# Altium schematic symbol library LATTICEPLDS_Library.SchLib: 291 symbols (part 21 of 32) (continued)
## LFE5UM-85F-BG554 (continued)
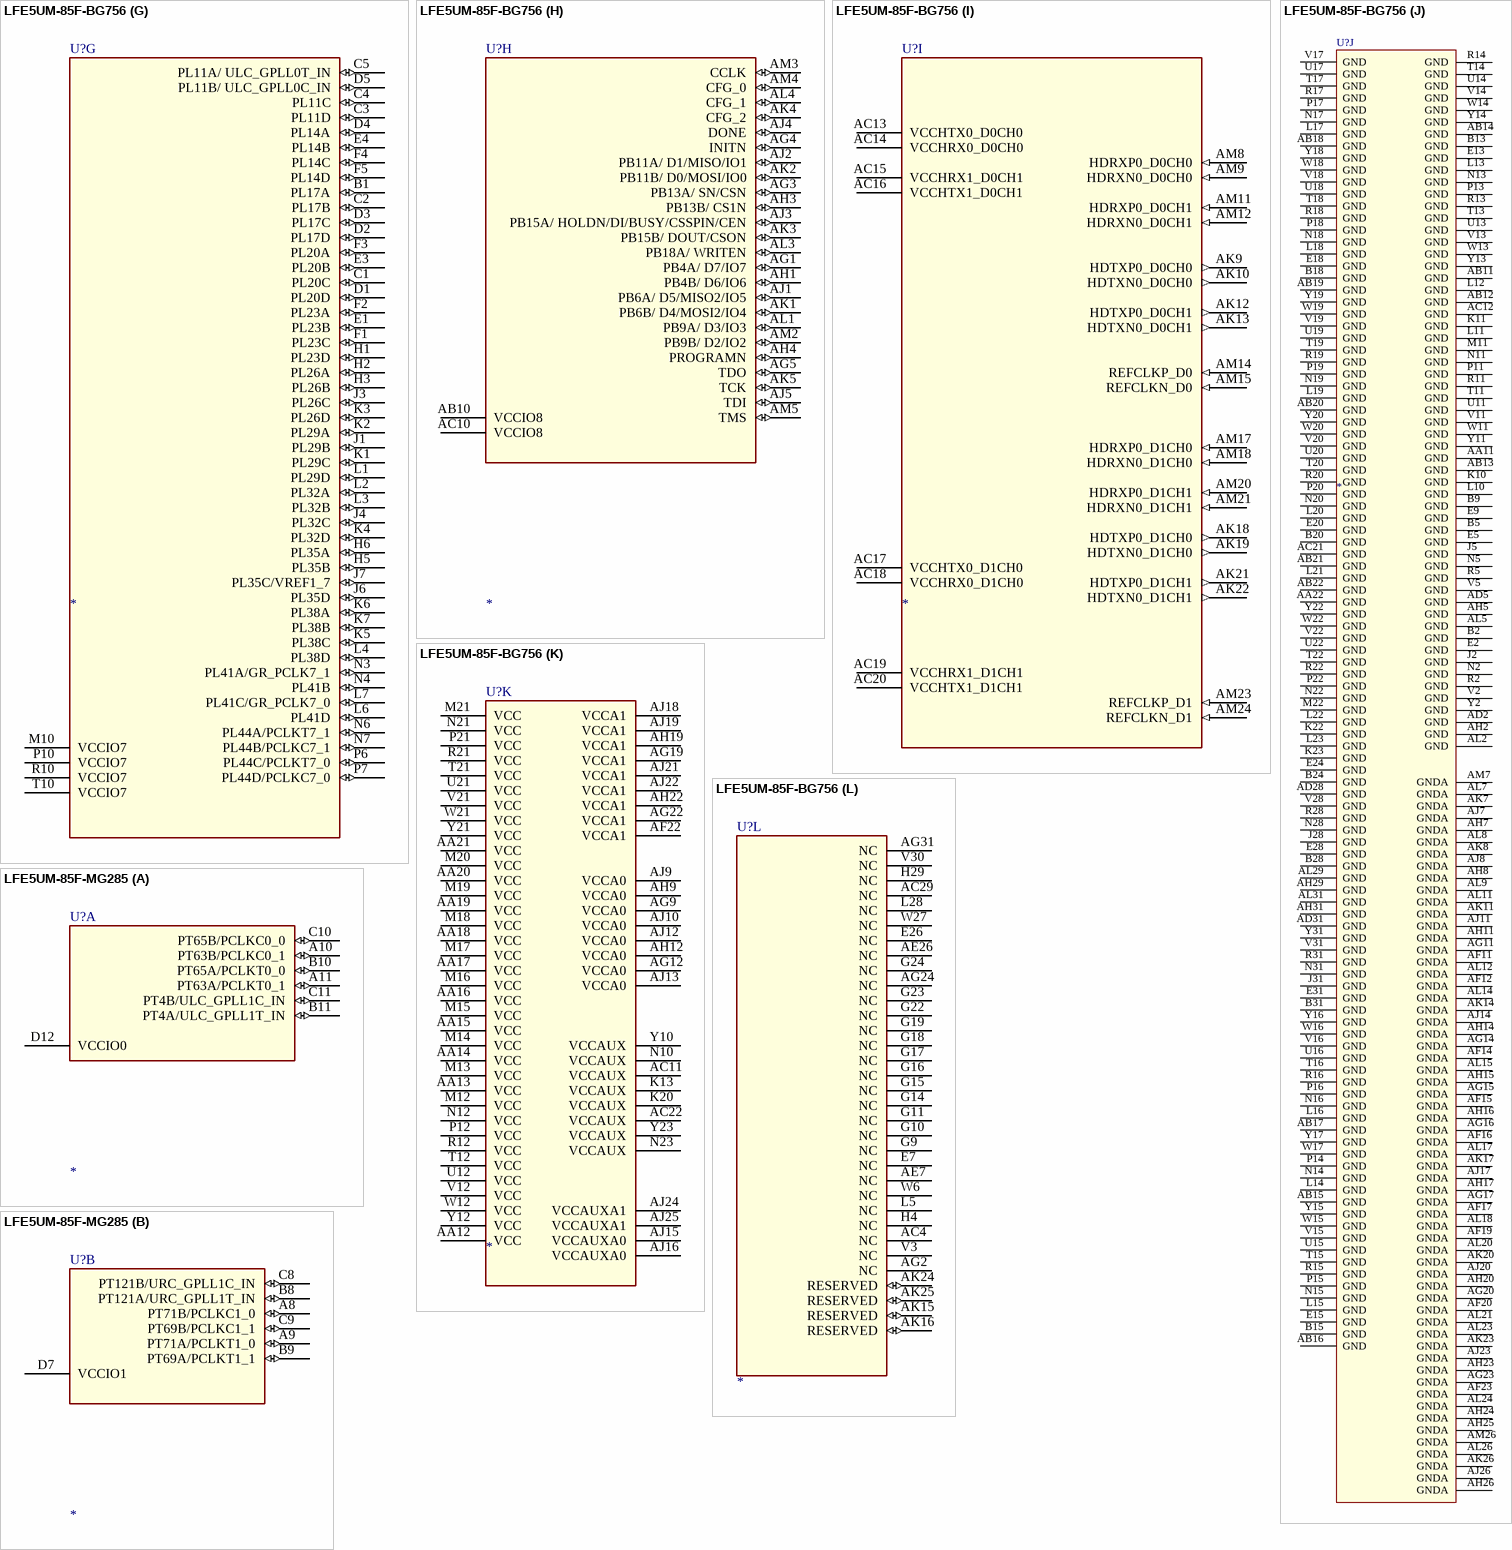
[diagram p203: symbols LFE5UM-85F-BG756 to LFE5UM-85F-MG285]

## LFE5UM-85F-BG756
designator U?
SWAP_INFO: (S1+S2+S3+S4+S5+S6+S7+S8+S9+S10+S11+S12); SPLIT_INST: TRUE
part A pins: A2 PT6A (io), A3 PT6B (io), A4 PT9A (io), A5 PT9B (io), A7 PT13B (io), A8 PT20B (io), A9 PT24B (io), A10 PT31B (io), A11 PT38B (io), A13 PT42B (io), A14 PT49B (io), A15 PT54B (io), A16 PT60B/ GR_PCLK0_0 (io), A17 PT63A/ PCLKT0_1 (io), B3 PT4A/ ULC_GPLL1T_IN (io), B4 PT4B/ ULC_GPLL1C_IN (io), B7 PT13A (io), B8 PT20A (io), B10 PT31A (io), B11 PT38A (io), B14 PT49A (io), B16 PT60A/ GR_PCLK0_1 (io), B17 PT63B/ PCLKC0_1 (io), C7 PT11B (io), C8 PT18B (io), C9 PT24A (io), C10 PT29B (io), C11 PT36B (io), C13 PT42A (io), C14 PT47B (io), C15 PT54A (io), C16 PT58B (io), C17 PT65A/ PCLKT0_0 (io), D7 PT11A (io), D8 PT18A (io), D9 PT22B (io), D10 PT29A (io), D11 PT36A (io), D13 PT40B (io), D14 PT47A (io), D15 PT51B (io), D16 PT58A (io), D17 PT65B/ PCLKC0_0 (io), E8 PT15B (io), E10 PT27B (io), E11 PT33B (io), E14 PT45B (io), E16 PT56B (io), F8 PT15A (io), F9 PT22A (io), F10 PT27A (io), F11 PT33A (io), F13 PT40A (io), F14 PT45A (io), F15 PT51A (io), F16 PT56A (io), K12 VCCIO0 (power), K14 VCCIO0 (power), K15 VCCIO0 (power), K16 VCCIO0 (power)
part B pins: A18 PT71A/ PCLKT1_0 (io), A19 PT76A (io), A20 PT83A (io), A22 PT87A (io), A23 PT94A (io), A24 PT101A (io), A25 PT105A (io), A26 PT112A (io), A28 PT116A (io), A29 PT116B (io), A30 PT119A (io), A31 PT119B (io), B19 PT76B (io), B22 PT87B (io), B23 PT94B (io), B25 PT105B (io), B26 PT112B (io), B29 PT121A/ URC_GPLL1T_IN (io), B30 PT121B/URC_GPLL1C_IN (io), C18 PT71B/ PCLKC1_0 (io), C19 PT78A (io), C20 PT83B (io), C22 PT89A (io), C23 PT96A (io), C24 PT101B (io), C25 PT107A (io), C26 PT114A (io), D18 PT74A/ GR_PCLK1_0 (io), D19 PT78B (io), D20 PT85A (io), D22 PT89B (io), D23 PT96B (io), D24 PT103A (io), D25 PT107B (io), D26 PT114B (io), E17 PT69A/ PCLKT1_1 (io), E19 PT80A (io), E22 PT92A (io), E23 PT98A (io), E25 PT110A (io), F17 PT69B/ PCLKC1_1 (io), F18 PT74B/ GR_PCLK1_1 (io), F19 PT80B (io), F20 PT85B (io), F22 PT92B (io), F23 PT98B (io), F24 PT103B (io), F25 PT110B (io), K17 VCCIO1 (power), K18 VCCIO1 (power), K19 VCCIO1 (power), K21 VCCIO1 (power)
part C pins: B32 PR17A (io), C28 PR11A/ URC_GPLL0T_IN (io), C29 PR11C (io), C30 PR11D (io), C31 PR17B (io), C32 PR20C (io), D28 PR11B/ URC_GPLL0C_IN (io), D29 PR14A (io), D30 PR17C (io), D31 PR17D (io), D32 PR20D (io), E29 PR14B (io), E30 PR20B (io), E32 PR23B (io), F28 PR14D (io), F29 PR14C (io), F30 PR20A (io), F31 PR23A (io), F32 PR23C (io), H27 PR35A (io), H28 PR35B (io), H30 PR26B (io), H31 PR26A (io), H32 PR23D (io), J26 PR35C/ VREF1_2 (io), J27 PR35D (io), J29 PR32C (io), J30 PR26C (io), J32 PR29B (io), K26 PR38B (io), K27 PR38A (io), K28 PR38C (io), K29 PR32D (io), K30 PR26D (io), K31 PR29A (io), K32 PR29C (io), L26 PR41C/ GR_PCLK2_0 (io), L27 PR41D (io), L29 PR38D (io), L30 PR32B (io), L31 PR32A (io), L32 PR29D (io), M23 VCCIO2 (power), N26 PR44B/ PCLKC2_1 (io), N27 PR44A/ PCLKT2_1 (io), N29 PR41B (io), N30 PR41A/ GR_PCLK2_1 (io), P23 VCCIO2 (power), P26 PR44D/ PCLKC2_0 (io), P27 PR44C/ PCLKT2_0 (io), R23 VCCIO2 (power), T23 VCCIO2 (power)
part D pins: AA23 VCCIO3 (power), AB26 PR74C (io), AB27 PR77B (io), AB28 PR77A (io), AB29 PR83B (io), AB30 PR83A (io), AB31 PR89B (io), AB32 PR92A (io), AC26 PR77C (io), AC27 PR74D (io), AC28 PR83C (io), AC30 PR89A (io), AC31 PR89C (io), AC32 PR92B (io), AD26 PR77D (io), AD27 PR80A (io), AD29 PR83D (io), AD30 PR86C (io), AD32 PR92C/ LRC_GPLL0T_IN (io), AE27 PR80B (io), AE28 PR80C (io), AE29 PR80D (io), AE30 PR86D (io), AE31 PR89D (io), AE32 PR92D/ LRC_GPLL0C_IN (io), N32 PR62A (io), P28 PR47A/ PCLKT3_1 (power), P29 PR47B /PCLKC3_1 (io), P30 PR59B (io), P31 PR59A (io), P32 PR62B (io), R26 PR47C /  PCLKT3_0 (io), R27 PR50A/ GR_PCLK3_0 (io), R29 PR53A (io), R30 PR59C (io), R32 PR65A (io), T26 PR47D/ PCLKC3_0 (io), T27 PR50B (io), T28 PR53B (io), T29 PR53C (io), T30 PR59D (io), T31 PR65B (io), T32 PR68A (io), U23 VCCIO3 (power), U26 PR50D (io), U27 PR50C/ GR_PCLK3_1 (io), U28 PR53D (io), U29 PR56A (io), U30 PR62D (io), U31 PR62C (io), U32 PR68B (io), V23 VCCIO3 (power), V26 PR56D (io), V27 PR56C (io), V29 PR56B/ VREF1_3 (io), V32 PR68C (io), W23 VCCIO3 (power), W28 PR71D (io), W29 PR74B (io), W30 PR65C (io), W31 PR86A (io), W32 PR68D (io), Y26 PR71A (io), Y27 PR71B (io), Y28 PR71C (io), Y29 PR74A (io), Y30 PR65D (io), Y32 PR86B (io)
part E pins: AB23 VCCIO4 (power), AC23 VCCIO4 (power), AG28 PB110A (io), AG29 PB110B (io), AG30 PB114B (io), AG32 PB119B (io), AH28 PB112B (io), AH30 PB114A (io), AH32 PB119A (io), AJ28 PB112A (io), AJ29 PB121A (io), AJ30 PB121B (io), AJ31 PB105B (io), AJ32 PB101B (io), AK28 PB98B (io), AK29 PB116A (io), AK30 PB116B (io), AK31 PB105A (io), AK32 PB101A (io), AL28 PB98A (io), AL30 PB103B (io), AL32 PB107B (io), AM28 PB96A (io), AM29 PB96B (io), AM30 PB103A (io), AM31 PB107A (io)
part F pins: AA10 VCCIO6 (power), AB1 PL92A (io), AB2 PL89B (io), AB3 PL83A (io), AB4 PL83B (io), AB5 PL77A (io), AB6 PL77B (io), AB7 PL74C (io), AC1 PL92B (io), AC2 PL89C (io), AC3 PL89A (io), AC5 PL83C (io), AC6 PL74D (io), AC7 PL77C (io), AD1 PL92C/ LLC_GPLL0T_IN (io), AD3 PL86C (io), AD4 PL83D (io), AD6 PL80A (io), AD7 PL77D (io), AE1 PL92D/ LLC_GPLL0C_IN (io), AE2 PL89D (io), AE3 PL86D (io), AE4 PL80D (io), AE5 PL80C (io), AE6 PL80B (io), N1 PL62A (io), P1 PL62B (io), P2 PL59A (io), P3 PL59B (io), P4 PL47B/ PCLKC6_1 (io), P5 PL47A/ PCLKT6_1 (io), R1 PL65A (io), R3 PL59C (io), R4 PL53A (io), R6 PL50A/ GR_PCLK6_0 (io), R7 PL47C/ PCLKT6_0 (io), T1 PL68A (io), T2 PL65B (io), T3 PL59D (io), T4 PL53C (io), T5 PL53B (io), T6 PL50B (io), T7 PL47D/ PCLKC6_0 (io), U1 PL68B (io), U2 PL62C (io), U3 PL62D (io), U4 PL56A (io), U5 PL53D (io), U6 PL50C/ GR_PCLK6_1 (io), U7 PL50D (io), U10 VCCIO6 (power), V1 PL68C (io), V4 PL56B/ VREF1_6 (io), V6 PL56C (io), V7 PL56D (io), V10 VCCIO6 (power), W1 PL68D (io), W2 PL86A (io), W3 PL65C (io), W4 PL74B (io), W5 PL71D (io), W10 VCCIO6 (power), Y1 PL86B (io), Y3 PL65D (io), Y4 PL74A (io), Y5 PL71C (io), Y6 PL71B (io), Y7 PL71A (io)
part G pins: B1 PL17A (io), C1 PL20C (io), C2 PL17B (io), C3 PL11D (io), C4 PL11C (io), C5 PL11A/ ULC_GPLL0T_IN (io), D1 PL20D (io), D2 PL17D (io), D3 PL17C (io), D4 PL14A (io), D5 PL11B/ ULC_GPLL0C_IN (io), E1 PL23B (io), E3 PL20B (io), E4 PL14B (io), F1 PL23C (io), F2 PL23A (io), F3 PL20A (io), F4 PL14C (io), F5 PL14D (io), H1 PL23D (io), H2 PL26A (io), H3 PL26B (io), H5 PL35B (io), H6 PL35A (io), J1 PL29B (io), J3 PL26C (io), J4 PL32C (io), J6 PL35D (io), J7 PL35C/VREF1_7 (io), K1 PL29C (io), K2 PL29A (io), K3 PL26D (io), K4 PL32D (io), K5 PL38C (io), K6 PL38A (io), K7 PL38B (io), L1 PL29D (io), L2 PL32A (io), L3 PL32B (io), L4 PL38D (io), L6 PL41D (io), L7 PL41C/GR_PCLK7_0 (io), M10 VCCIO7 (power), N3 PL41A/GR_PCLK7_1 (io), N4 PL41B (io), N6 PL44A/PCLKT7_1 (io), N7 PL44B/PCLKC7_1 (io), P6 PL44C/PCLKT7_0 (io), P7 PL44D/PCLKC7_0 (io), P10 VCCIO7 (power), R10 VCCIO7 (power), T10 VCCIO7 (power)
part H pins: AB10 VCCIO8 (power), AC10 VCCIO8 (power), AG1 PB4A/ D7/IO7 (io), AG3 PB13A/ SN/CSN (io), AG4 INITN (io), AG5 TDO (io), AH1 PB4B/ D6/IO6 (io), AH3 PB13B/ CS1N (io), AH4 PROGRAMN (io), AJ1 PB6A/ D5/MISO2/IO5 (io), AJ2 PB11A/ D1/MISO/IO1 (io), AJ3 PB15A/ HOLDN/DI/BUSY/CSSPIN/CEN (io), AJ4 DONE (io), AJ5 TDI (io), AK1 PB6B/ D4/MOSI2/IO4 (io), AK2 PB11B/ D0/MOSI/IO0 (io), AK3 PB15B/ DOUT/CSON (io), AK4 CFG_2 (io), AK5 TCK (io), AL1 PB9A/ D3/IO3 (io), AL3 PB18A/ WRITEN (io), AL4 CFG_1 (io), AM2 PB9B/ D2/IO2 (io), AM3 CCLK (io), AM4 CFG_0 (io), AM5 TMS (io)
part I pins: AC13 VCCHTX0_D0CH0 (power), AC14 VCCHRX0_D0CH0 (power), AC15 VCCHRX1_D0CH1 (power), AC16 VCCHTX1_D0CH1 (power), AC17 VCCHTX0_D1CH0 (power), AC18 VCCHRX0_D1CH0 (power), AC19 VCCHRX1_D1CH1 (power), AC20 VCCHTX1_D1CH1 (power), AK9 HDTXP0_D0CH0 (out), AK10 HDTXN0_D0CH0 (out), AK12 HDTXP0_D0CH1 (out), AK13 HDTXN0_D0CH1 (out), AK18 HDTXP0_D1CH0 (out), AK19 HDTXN0_D1CH0 (out), AK21 HDTXP0_D1CH1 (out), AK22 HDTXN0_D1CH1 (out), AM8 HDRXP0_D0CH0 (in), AM9 HDRXN0_D0CH0 (in), AM11 HDRXP0_D0CH1 (in), AM12 HDRXN0_D0CH1 (in), AM14 REFCLKP_D0 (in), AM15 REFCLKN_D0 (in), AM17 HDRXP0_D1CH0 (in), AM18 HDRXN0_D1CH0 (in), AM20 HDRXP0_D1CH1 (in), AM21 HDRXN0_D1CH1 (in), AM23 REFCLKP_D1 (in), AM24 REFCLKN_D1 (in)
part J pins: AA11 GND (power), AA22 GND (power), AB11 GND (power), AB12 GND (power), AB13 GND (power), AB14 GND (power), AB15 GND (power), AB16 GND (power), AB17 GND (power), AB18 GND (power), AB19 GND (power), AB20 GND (power), AB21 GND (power), AB22 GND (power), AC12 GND (power), AC21 GND (power), AD2 GND (power), AD5 GND (power), AD28 GND (power), AD31 GND (power), AF11 GNDA (power), AF12 GNDA (power), AF14 GNDA (power), AF15 GNDA (power), AF16 GNDA (power), AF17 GNDA (power), AF19 GNDA (power), AF20 GNDA (power), AF23 GNDA (power), AG11 GNDA (power), AG14 GNDA (power), AG15 GNDA (power), AG16 GNDA (power), AG17 GNDA (power), AG20 GNDA (power), AG23 GNDA (power), AH2 GND (power), AH5 GND (power), AH7 GNDA (power), AH8 GNDA (power), AH11 GNDA (power), AH14 GNDA (power), AH15 GNDA (power), AH16 GNDA (power), AH17 GNDA (power), AH20 GNDA (power), AH23 GNDA (power), AH24 GNDA (power), AH25 GNDA (power), AH26 GNDA (power), AH29 GND (power), AH31 GND (power), AJ7 GNDA (power), AJ8 GNDA (power), AJ11 GNDA (power), AJ14 GNDA (power), AJ17 GNDA (power), AJ20 GNDA (power), AJ23 GNDA (power), AJ26 GNDA (power), AK7 GNDA (power), AK8 GNDA (power), AK11 GNDA (power), AK14 GNDA (power), AK17 GNDA (power), AK20 GNDA (power), AK23 GNDA (power), AK26 GNDA (power), AL2 GND (power), AL5 GND (power), AL7 GNDA (power), AL8 GNDA (power), AL9 GNDA (power), AL11 GNDA (power), AL12 GNDA (power), AL14 GNDA (power), AL15 GNDA (power), AL17 GNDA (power), AL18 GNDA (power), AL20 GNDA (power), AL21 GNDA (power), AL23 GNDA (power), AL24 GNDA (power), AL26 GNDA (power), AL29 GND (power), AL31 GND (power), AM7 GNDA (power), AM26 GNDA (power), B2 GND (power), B5 GND (power), B9 GND (power), B13 GND (power), B15 GND (power), B18 GND (power), B20 GND (power), B24 GND (power), B28 GND (power), B31 GND (power), E2 GND (power), E5 GND (power), E9 GND (power), E13 GND (power), E15 GND (power), E18 GND (power), E20 GND (power), E24 GND (power), E28 GND (power), E31 GND (power), J2 GND (power), J5 GND (power), J28 GND (power), J31 GND (power), K10 GND (power), K11 GND (power), K22 GND (power), K23 GND (power), L10 GND (power), L11 GND (power), L12 GND (power), L13 GND (power), L14 GND (power), L15 GND (power), L16 GND (power), L17 GND (power), L18 GND (power), L19 GND (power), L20 GND (power), L21 GND (power), L22 GND (power), L23 GND (power), M11 GND (power), M22 GND (power), N2 GND (power), N5 GND (power), N11 GND (power), N13 GND (power), N14 GND (power), N15 GND (power), N16 GND (power), N17 GND (power), N18 GND (power), N19 GND (power), N20 GND (power), N22 GND (power), N28 GND (power), N31 GND (power), P11 GND (power), P13 GND (power), P14 GND (power), P15 GND (power), P16 GND (power), P17 GND (power), P18 GND (power), P19 GND (power), P20 GND (power), P22 GND (power), R2 GND (power), R5 GND (power), R11 GND (power), R13 GND (power), R14 GND (power), R15 GND (power), R16 GND (power), R17 GND (power), R18 GND (power), R19 GND (power), R20 GND (power), R22 GND (power), R28 GND (power), R31 GND (power), T11 GND (power), T13 GND (power), T14 GND (power), T15 GND (power), T16 GND (power), T17 GND (power), T18 GND (power), T19 GND (power), T20 GND (power), T22 GND (power), U11 GND (power), U13 GND (power), U14 GND (power), U15 GND (power), U16 GND (power), U17 GND (power), U18 GND (power), U19 GND (power), U20 GND (power), U22 GND (power), V2 GND (power), V5 GND (power), V11 GND (power), V13 GND (power), V14 GND (power), V15 GND (power), V16 GND (power), V17 GND (power), V18 GND (power), V19 GND (power), V20 GND (power), V22 GND (power), V28 GND (power), V31 GND (power), W11 GND (power), W13 GND (power), W14 GND (power), W15 GND (power), W16 GND (power), W17 GND (power), W18 GND (power), W19 GND (power), W20 GND (power), W22 GND (power), Y2 GND (power), Y11 GND (power), Y13 GND (power), Y14 GND (power), Y15 GND (power), Y16 GND (power), Y17 GND (power), Y18 GND (power), Y19 GND (power), Y20 GND (power), Y22 GND (power), Y31 GND (power)
part K pins: AA12 VCC (power), AA13 VCC (power), AA14 VCC (power), AA15 VCC (power), AA16 VCC (power), AA17 VCC (power), AA18 VCC (power), AA19 VCC (power), AA20 VCC (power), AA21 VCC (power), AC11 VCCAUX (power), AC22 VCCAUX (power), AF22 VCCA1 (power), AG9 VCCA0 (power), AG12 VCCA0 (power), AG19 VCCA1 (power), AG22 VCCA1 (power), AH9 VCCA0 (power), AH12 VCCA0 (power), AH19 VCCA1 (power), AH22 VCCA1 (power), AJ9 VCCA0 (power), AJ10 VCCA0 (power), AJ12 VCCA0 (power), AJ13 VCCA0 (power), AJ15 VCCAUXA0 (power), AJ16 VCCAUXA0 (power), AJ18 VCCA1 (power), AJ19 VCCA1 (power), AJ21 VCCA1 (power), AJ22 VCCA1 (power), AJ24 VCCAUXA1 (power), AJ25 VCCAUXA1 (power), K13 VCCAUX (power), K20 VCCAUX (power), M12 VCC (power), M13 VCC (power), M14 VCC (power), M15 VCC (power), M16 VCC (power), M17 VCC (power), M18 VCC (power), M19 VCC (power), M20 VCC (power), M21 VCC (power), N10 VCCAUX (power), N12 VCC (power), N21 VCC (power), N23 VCCAUX (power), P12 VCC (power), P21 VCC (power), R12 VCC (power), R21 VCC (power), T12 VCC (power), T21 VCC (power), U12 VCC (power), U21 VCC (power), V12 VCC (power), V21 VCC (power), W12 VCC (power), W21 VCC (power), Y10 VCCAUX (power), Y12 VCC (power), Y21 VCC (power), Y23 VCCAUX (power)
part L pins: AC4 NC (power), AC29 NC (power), AE7 NC (power), AE26 NC (power), AG2 NC (power), AG24 NC (power), AG31 NC (power), AK15 RESERVED (io), AK16 RESERVED (io), AK24 RESERVED (io), AK25 RESERVED (io), E7 NC (power), E26 NC (power), G9 NC (power), G10 NC (power), G11 NC (power), G14 NC (power), G15 NC (power), G16 NC (power), G17 NC (power), G18 NC (power), G19 NC (power), G22 NC (power), G23 NC (power), G24 NC (power), H4 NC (power), H29 NC (power), L5 NC (power), L28 NC (power), V3 NC (power), V30 NC (power), W6 NC (power), W27 NC (power)

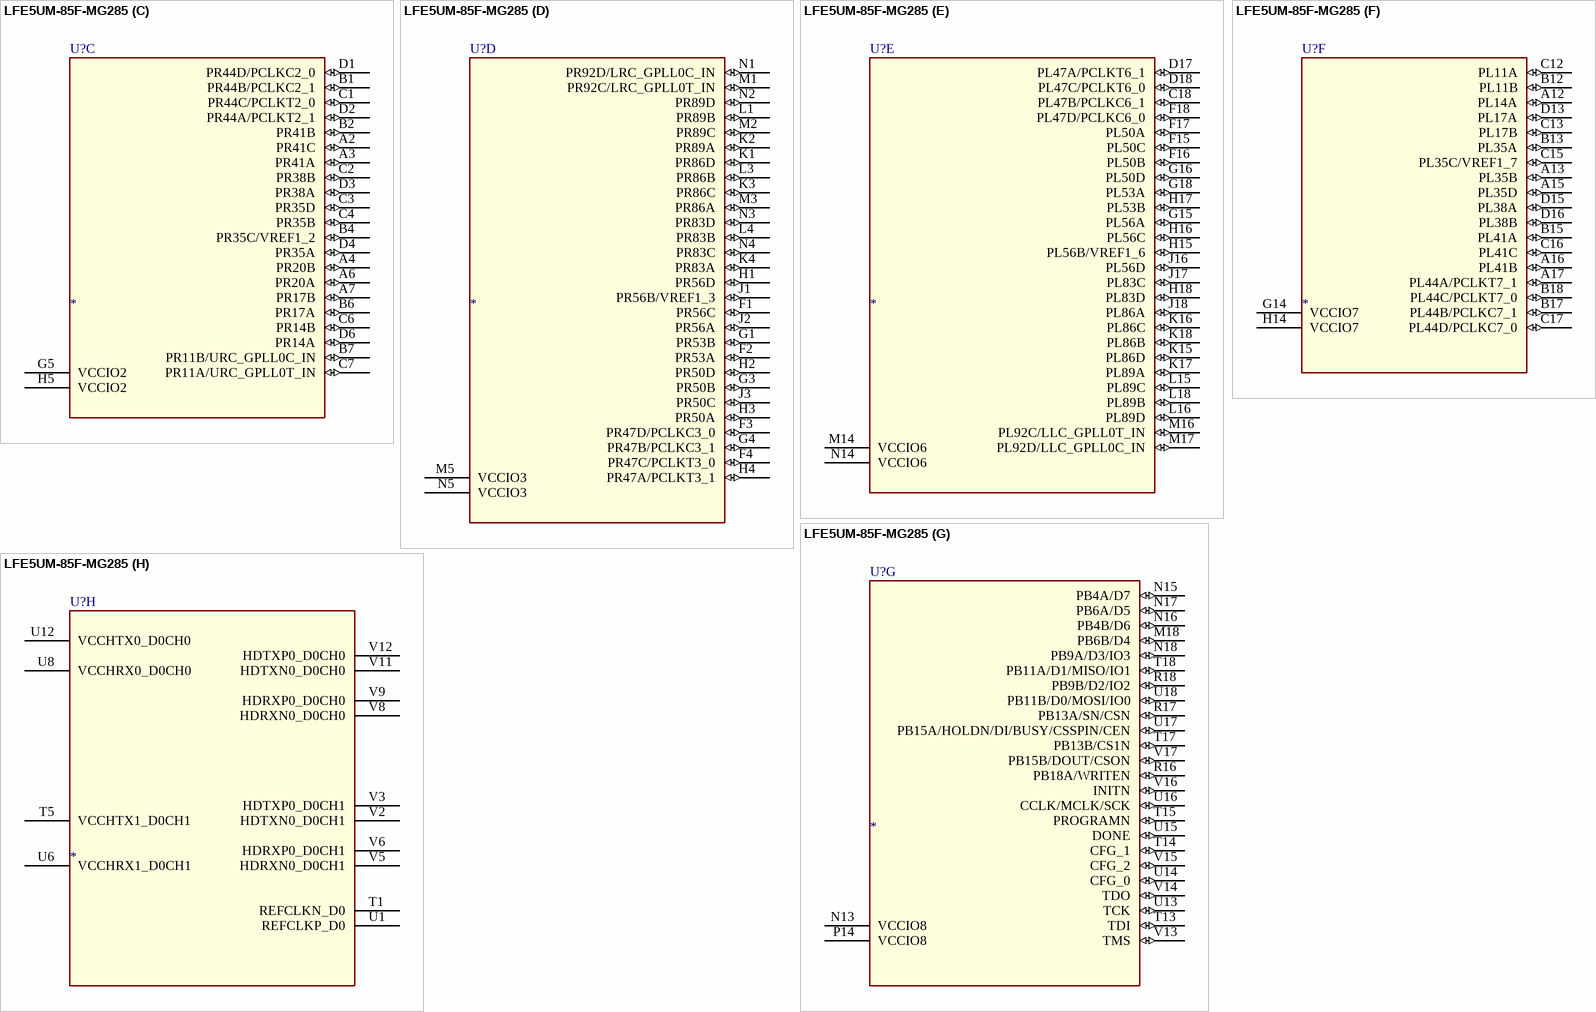
[diagram p204: symbol LFE5UM-85F-MG285]

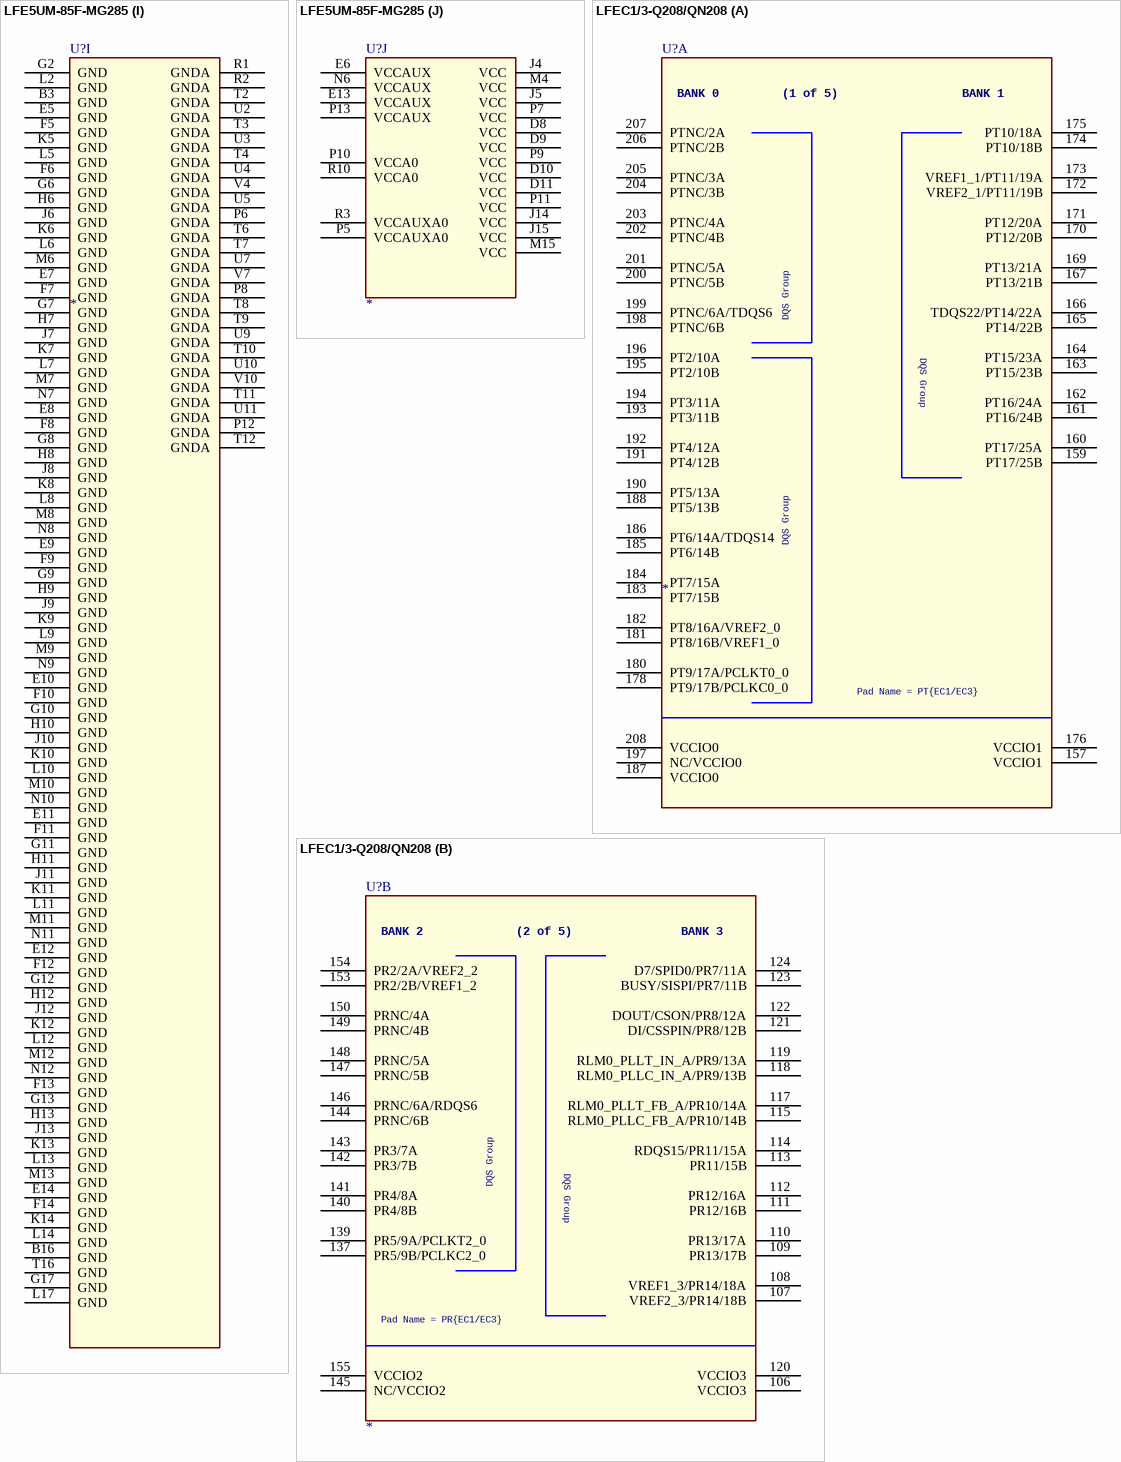
[diagram p205: symbols LFE5UM-85F-MG285 to LFEC1/3-Q208/QN208]